# Altium footprint library PCB_Kursus_Library.PcbLib: 27 footprints (part 2 of 2)
Each footprint in its own frame and in the unit in brackets; x right, y up, seen from the top. Pads: shape width x height; smd on the part's side, far side on the other; paste and mask are expansions set on the pad; w line width, h text height; cw(c..) or ccw(c..) is an arc to the next point about the centre after c.
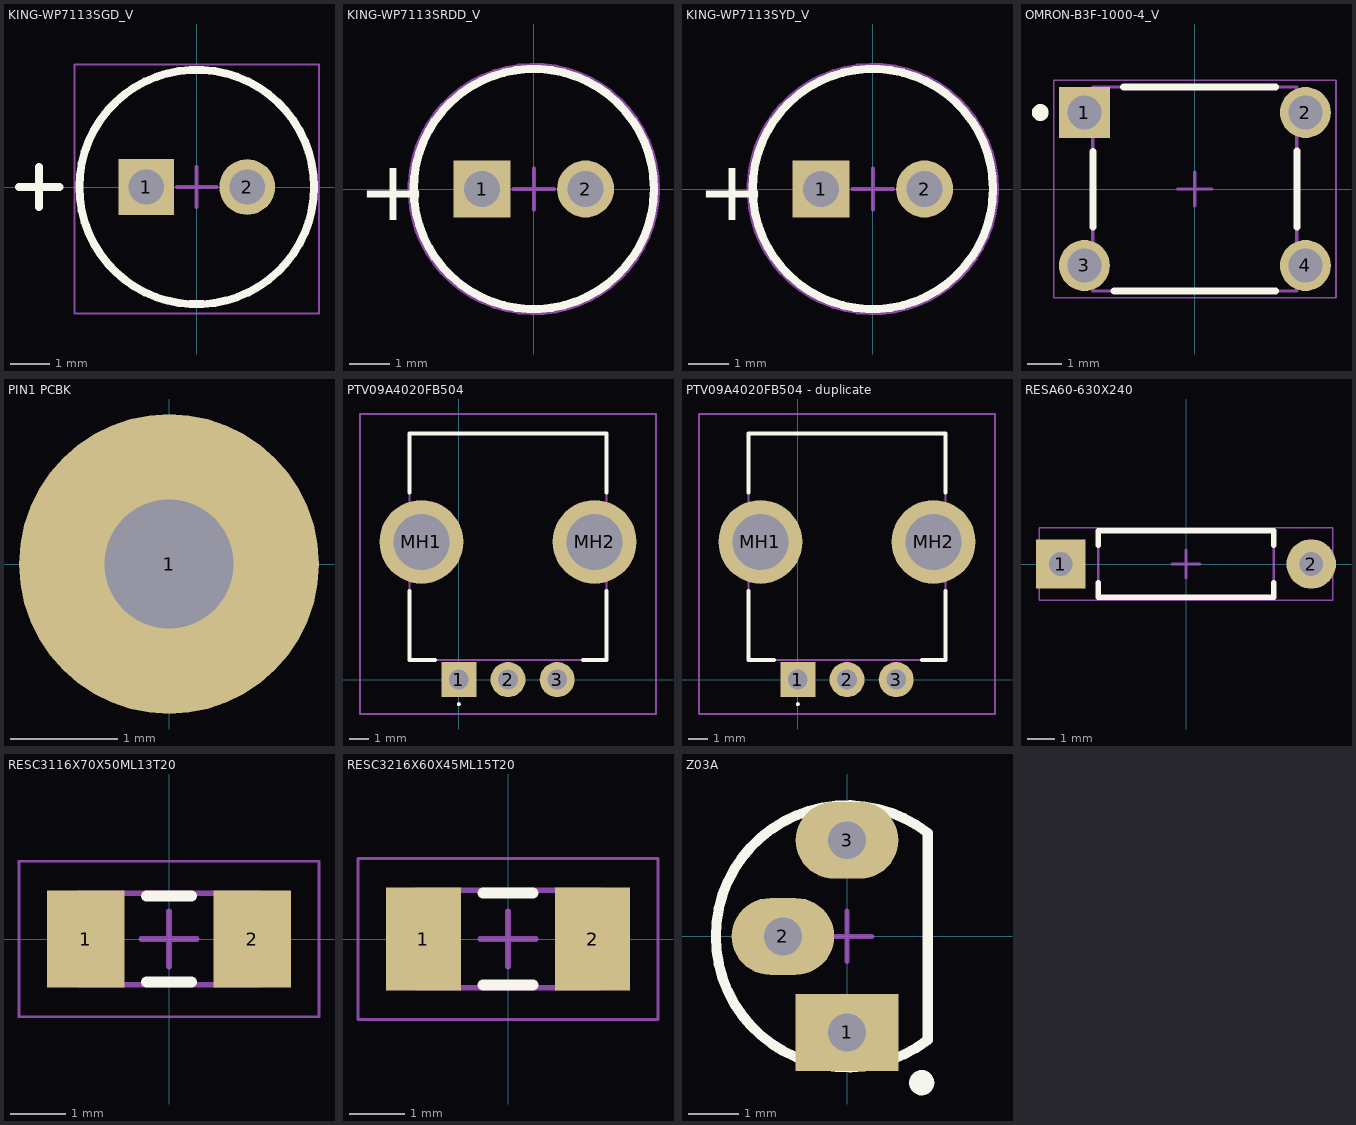
[diagram p1: the footprints below, top view; thin cyan lines are the x and y axes]

## KING-WP7113SGD_V [mm]
pads (2):
  rect 1.4x1.4 hole 0.889: 1(-1.27,0)
  round 1.4 hole 0.889: 2(1.27,0)
Top Overlay:
  circle w0.2: c0,0 r2.95
  lines w0.2: -4.466,0 -3.45,0 ; -3.958,-0.508 -3.958,-0.254 -3.958,0.254 -3.958,0.508
Mechanical 13:
  circle w0.1: c0,0 r2.95
Mechanical 15:
  lines w0.05: -3.075,-3.175 -3.075,3.075 3.075,3.075 3.075,-3.175 -3.075,-3.175
  lines w0.1: -0.5,0 0.5,0 ; 0,-0.5 0,0.5
3D body "WP7113.STEP": height 15.5, standoff -20.1, extent -2.95,-2.95 2.5,2.95

## KING-WP7113SRDD_V [mm]
pads (2):
  rect 1.4x1.4 hole 0.889: 1(-1.27,0)
  round 1.4 hole 0.889: 2(1.27,0)
Top Overlay:
  circle w0.2: c0,0 r2.95
  text "+" at -4.318,-0.762 h1.5
Mechanical 13:
  circle w0.1: c0,0 r2.95
Mechanical 15:
  circle w0.1: c0,0 r3.05
  lines w0.1: -0.5,0 0.5,0 ; 0,-0.5 0,0.5
3D body "WP7113.STEP": height 15.5, standoff -20.1, extent -2.95,-2.95 2.5,2.95

## KING-WP7113SYD_V [mm]
pads (2):
  rect 1.4x1.4 hole 0.889: 1(-1.27,0)
  round 1.4 hole 0.889: 2(1.27,0)
Top Overlay:
  circle w0.2: c0,0 r2.95
  text "+" at -4.318,-0.762 h1.5
Mechanical 13:
  circle w0.1: c0,0 r2.95
Mechanical 15:
  circle w0.1: c0,0 r3.05
  lines w0.1: -0.5,0 0.5,0 ; 0,-0.5 0,0.5
3D body "WP7113.STEP": height 15.5, standoff -20.1, extent -2.95,-2.95 2.5,2.95

## OMRON-B3F-1000-4_V [mm]
pads (4):
  rect 1.5x1.5 hole 1 paste-2539.97: 1(-3.25,2.25)
  round 1.5 hole 1 paste-2539.97: 2(3.25,2.25) 4(3.25,-2.25)
  round 1.5 hole 1 paste-2539.97 mask+0.102: 3(-3.25,-2.25)
Top Overlay:
  circle w0.25: c-4.55,2.25 r0.125
  lines w0.2: -3,-1.127 -3,1.1 ; -2.378,-3 2.378,-3 ; -2.1,3 2.378,3 ; 3,-1.127 3,1.127
Mechanical 13:
  lines w0.1: -3,-3 3,-3 3,3 -3,3 -3,-3
Mechanical 15:
  lines w0.05: -4.15,-3.2 4.15,-3.2 4.15,3.2 -4.15,3.2 -4.15,-3.2
  lines w0.1: -0.5,0 0.5,0 ; 0,-0.5 0,0.5
3D body: height 3.4, standoff 0, extent -3,-3 3,3
3D body: height 4.5, standoff 0.1, extent -1.75,-1.75 1.749,1.749
3D body: height 0.5, standoff -3.5, extent -3.4,1.901 -3.101,2.599
3D body: height 0.8, standoff 0.5, extent -3.4,1.901 -2.801,2.599
3D body: height 0.8, standoff 0.5, extent 2.801,-2.599 3.4,-1.901
3D body: height 0.5, standoff -3.5, extent 3.101,-2.599 3.4,-1.901
3D body: height 0.8, standoff 0.5, extent -3.4,-2.599 -2.801,-1.901
3D body: height 0.5, standoff -3.5, extent -3.4,-2.599 -3.101,-1.901
3D body: height 0.8, standoff 0.5, extent 2.801,1.901 3.4,2.599
3D body: height 0.5, standoff -3.5, extent 3.101,1.901 3.4,2.599
3D body: height 3.7, standoff 0.1, extent 1.501,1.501 2.499,2.499
3D body: height 3.7, standoff 0.1, extent -2.499,-2.499 -1.501,-1.501
3D body: height 3.7, standoff 0.1, extent 1.501,-2.499 2.499,-1.501
3D body: height 3.7, standoff 0.1, extent -2.499,1.501 -1.501,2.499

## PIN1 PCBK [mm]
pads (1):
  round 2.8 hole 1.2: 1(0,0)

## PTV09A4020FB504 [mm]
pads (5):
  rect 1.778x1.778 hole 1: 1(0,0)
  round 1.778 hole 1: 2(2.5,0) 3(5,0)
  round 4.26 hole 2.84: MH1(-1.9,7) MH2(6.9,7)
Top Overlay:
  lines w0.1: 0,-1.3 cw(c0,-1.25) 0,-1.2 cw(c0,-1.25) 0,-1.3
  lines w0.2: -2.5,4.5 -2.5,1 -1.2,1 ; -2.5,9.5 -2.5,12.5 7.5,12.5 7.5,9.5 ; 6.3,1 7.5,1 7.5,4.5
Mechanical 15:
  lines w0.1: -2.5,1 7.5,1 7.5,12.5 -2.5,12.5 -2.5,1
Bottom Assembly:
  lines w0.1: -5.03,-1.75 10.03,-1.75 10.03,13.5 -5.03,13.5 -5.03,-1.75
3D body "R-0904N-L-20KQ-black.step": height 20, standoff -3.79, extent -3.121,-0.242 8.201,12.358

## PTV09A4020FB504 - duplicate [mm]
pads (5):
  rect 1.778x1.778 hole 1: 1(0,0)
  round 1.778 hole 1: 2(2.5,0) 3(5,0)
  round 4.26 hole 2.84: MH1(-1.9,7) MH2(6.9,7)
Top Overlay:
  lines w0.1: 0,-1.3 ccw(c0,-1.25) 0,-1.2 ccw(c0,-1.25) 0,-1.3
  lines w0.2: -2.5,4.5 -2.5,1 -1.2,1 ; -2.5,9.5 -2.5,12.5 7.5,12.5 7.5,9.5 ; 6.3,1 7.5,1 7.5,4.5
Mechanical 15:
  lines w0.1: -2.5,1 -2.5,12.5 7.5,12.5 7.5,1 -2.5,1
Bottom Assembly:
  lines w0.1: -5.03,-1.75 -5.03,13.5 10.03,13.5 10.03,-1.75 -5.03,-1.75
3D body "R-0904N-L-20KQ-black.step": height 20, standoff -3.79, extent -3.121,-0.242 8.201,12.358

## RESA60-630X240 [mil]
pads (2):
  rect 70x70 hole 33.46: 1(-177.17,0)
  round 70 hole 33.46: 2(177.17,0)
Top Overlay:
  lines w7.87: -124.02,-26.54 -124.02,-47.24 124.02,-47.24 124.02,-26.54 ; -124.02,26.54 -124.02,47.24 124.02,47.24 124.02,26.54
Mechanical 13:
  lines w3.94: -124.02,-47.24 124.02,-47.24 124.02,47.24 -124.02,47.24 -124.02,-47.24
Mechanical 15:
  lines w1.97: -207.68,-51.18 -207.68,51.18 207.68,51.18 207.68,-51.18 -207.68,-51.18
  lines w3.94: -19.68,0 19.68,0 ; 0,-19.68 0,19.68
3D body: height 58.07, standoff 36.42, extent 166.33,-10.75 187.98,10.75
3D body: height 57.99, standoff 36.42, extent 124.02,-10.8 177.17,10.81
3D body: height 47.24, standoff -78.74, extent 166.34,-10.8 187.91,10.81
3D body: height 47.24, standoff -78.74, extent -187.91,-10.81 -166.34,10.8
3D body: height 57.99, standoff 36.42, extent -177.17,-10.81 -124.02,10.8
3D body: height 58.07, standoff 36.42, extent -187.99,-10.75 -166.34,10.75
3D body: height 94.39, standoff 0.09, extent -124.01,-46.87 124.02,47.24

## RESC3116X70X50ML13T20 [mm]
pads (2):
  rect 1.4x1.75 smd: 1(-1.5,0) 2(1.5,0)
Top Overlay:
  lines w0.2: -0.4,-0.775 0.4,-0.775 ; -0.4,0.775 0.4,0.775
Mechanical 13:
  lines w0.1: -1.625,-0.825 -1.625,0.825 1.625,0.825 1.625,-0.825 -1.625,-0.825
Mechanical 15:
  lines w0.05: -2.7,-1.4 -2.7,1.4 2.7,1.4 2.7,-1.4 -2.7,-1.4
  lines w0.1: -0.5,0 0.5,0 ; 0,-0.5 0,0.5
3D body "RESC3115X07M.step": height 0.7, standoff 0, extent -1.625,-0.825 1.625,0.825

## RESC3216X60X45ML15T20 [mm]
pads (2):
  rect 1.35x1.85 smd: 1(-1.525,0) 2(1.525,0)
Top Overlay:
  lines w0.2: -0.45,-0.825 0.45,-0.825 ; -0.45,0.825 0.45,0.825
Mechanical 13:
  lines w0.1: -1.65,-0.875 -1.65,0.875 1.65,0.875 1.65,-0.875 -1.65,-0.875
Mechanical 15:
  lines w0.05: -2.7,-1.45 -2.7,1.45 2.7,1.45 2.7,-1.45 -2.7,-1.45
  lines w0.1: -0.5,0 0.5,0 ; 0,-0.5 0,0.5
3D body "RESC3116X06M.step": height 0.6, standoff 0, extent -1.65,-0.875 1.65,0.875

## Z03A [mil]
pads (3):
  rect 80x60 hole 29.53: 1(0,-75)
  oval 80x60 hole 29.53: 2(-50,0) 3(0,75)
Top Overlay:
  circle w9.84: c58.27,-114.17 r4.92
  lines w7.87: 63.02,-80.66 cw(c0,0) 63.02,80.66 62.99,-80.66
Mechanical 13:
  lines w3.94: 63.02,-80.66 cw(c0,0) 63.02,80.66 62.99,-80.66
Mechanical 15:
  lines w3.94: -19.68,0 19.68,0 ; 0,-19.68 0,19.69
3D body: height 204.72, standoff 0, extent -102.34,-102.78 62.97,102.78